# Altium schematic symbol library microbuilder.SCHLIB: 530 symbols (part 4 of 7) (continued)
## LPC1768
designator U?, comment LPC1768    100 MHz 32-bit ARM Cortex-M3 based microcontroller featuring a high level of integration and low power consumption. 512 kB Flash, 64 kB SRAM, USB Device/Host/OTG, Ethernet, CAN, I2S, 10-bit DAC    Digikey: 568-4796-ND
footprint LQFP100
pins: 1 TDO/SWO, 2 TDI, 3 TMS/SWDIO, 4 TRST, 5 TCK/SWDCLK, 6 P0[26]/AD0[3]/AOUT/RXD3, 7 P0[25]/AD0[2]/I2SRX_SDA/TXD3, 8 P0[24]/AD0[1]/I2SRX_WS/CAP3[1], 9 P0[23]/AD0[0]/I2SRX_CLK/CAP3[0], 10 VDDA (power), 11 VSSA (power), 12 VREFP (power), 13 N.C., 14 RSTOUT, 15 VREFN (power), 16 RTCX1, 17 RESET, 18 RTCX2, 19 VBAT (power), 20 P1[31]/SCK1/AD0[5], 21 P1[30]/VBUS/AD0[4], 22 XTAL1, 23 XTAL2, 24 P0[28]/SCL0/USB_SCL, 25 P0[27]/SDA0/USB_SDA, 26 P3[26]/STCLK/MAT0[1]/PWM1[3], 27 P3[25]/MAT0[0]/PWM1[2], 28 VDD(3V3)1 (power), 29 P0[29]/USB_D+, 30 P0[30]/USB_D-, 31 VSS1 (power), 32 P1[18]/USB_UP_LED/PWM1[1]/CAP1[0], 33 P1[19]/MC0A/USB_PPWR/CAP1[1], 34 P1[20]/MCFB0/PWM1[2]/SCK0, 35 P1[21]/MCABORT/PWM1[3]/SSEL0, 36 P1[22]/MC0B/USB_PWRD/MAT1[0], 37 P1[23]/MCFB1/PWM1[4]/MISO0, 38 P1[24]/MCFB2/PWM1[5]/MOSI0, 39 P1[25]/MC1A/MAT1[1], 40 P1[26]/MC1B/PWM1[6]/CAP0[0], 41 VSS2 (power), 42 VDD(REG)(3V3)1 (power), 43 P1[27]/CLKOUT/USB_OVRCR/CAP0[1], 44 P1[28]/MC2A/PCAP1[0]/MAT0[0], 45 P1[29]/MC2B/PCAP1[1]/MAT0[1], 46 P0[0]/RD1/TXD3/SDA1, 47 P0[1]/TD1/RXD3/SCL1, 48 P0[10]/TXD2/SDA2/MAT3[0], 49 P0[11]/RXD2/SCL2/MAT3[1], 50 P2[13]/EINT3/I2STX_SDA, 51 P2[12]/EINT2/I2STX_WS, 52 P2[11]/EINT1/I2STX_CLK, 53 P2[10]/EINT0/NMI, 54 VDD(3V3)2 (power), 55 VSS3 (power), 56 P0[22]/RTS1/TD1, 57 P0[21]/RI1/RD1, 58 P0[20]/DTR1/SCL1, 59 P0[19]/DSR1/SDA1, 60 P0[18]/DCD1/MOSI0/MOSI, 61 P0[17]/CTS1/MISO0/MISO, 62 P0[15]/TXD1/SCK0/SCK, 63 P0[16]/RXD1/SSEL0/SSEL, 64 P2[9]/USB_CONNECT/RXD2, 65 P2[8]/TD2/TXD2, 66 P2[7]/RD2/RTS1, 67 P2[6]/PCAP1[0]/RI1/TRACECLK, 68 P2[5]/PWM1[6]/DTR1/TRACEDATA[0], 69 P2[4]/PWM1[5]/DSR1/TRACEDATA[1], 70 P2[3]/PWM1[4]/DCD1/TRACEDATA[2], 71 VDD(3V3)3 (power), 72 VSS4 (power), 73 P2[2]/PWM1[3]/CTS1/TRACEDATA[3], 74 P2[1]/PWM1[2]/RXD1, 75 P2[0]/PWM1[1]/TXD1, 76 P0[9]/I2STX_SDA/MOSI1/MAT2[3], 77 P0[8]/I2STX_WS/MISO1/MAT2[2], 78 P0[7]/I2STX_CLK/SCK1/MAT2[1], 79 P0[6]/I2SRX_SDA/SSEL1/MAT2[0], 80 P0[5]/I2SRX_WS/TD2/CAP2[1], 81 P0[4]/I2SRX_CLK/RD2/CAP2[0], 82 P4[28]/RX_MCLK/MAT2[0]/TXD3, 83 VSS6 (power), 84 VDD(REG)(3V3)2 (power), 85 P4[29]/TX_MCLK/MAT2[1]/RXD3, 86 P1[17]/ENET_MDIO, 87 P1[16]/ENET_MDC, 88 P1[15]/ENET_REF_CLK, 89 P1[14]/ENET_RX_ER, 90 P1[10]/ENET_RXD1, 91 P1[9]/ENET_RXD0, 92 P1[8]/ENET_CRS, 93 P1[4]/ENET_TX_EN, 94 P1[1]/ENET_TXD1, 95 P1[0]/ENET_TXD0, 96 VDD(3V3)4 (power), 97 VSS5 (power), 98 P0[2]/TXD0/AD0[7], 99 P0[3]/RXD0/AD0[6], 100 RTCK

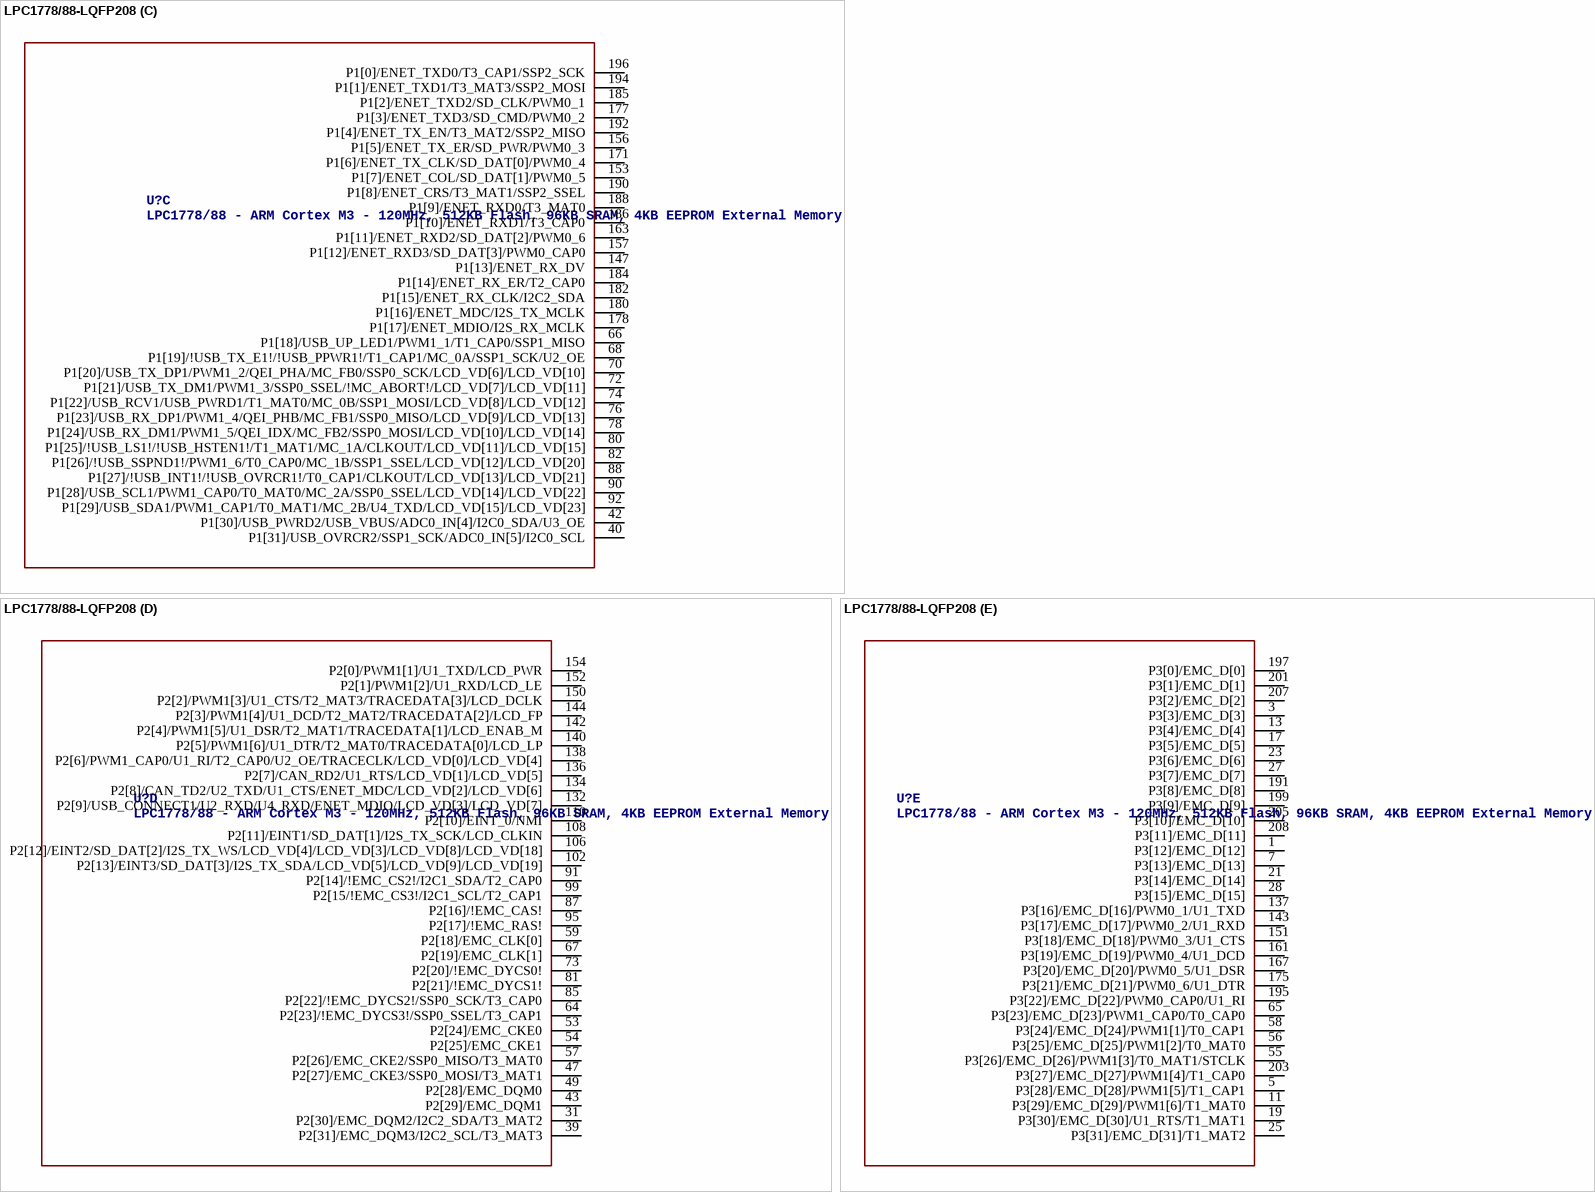
[diagram p34: symbol LPC1778/88-LQFP208]

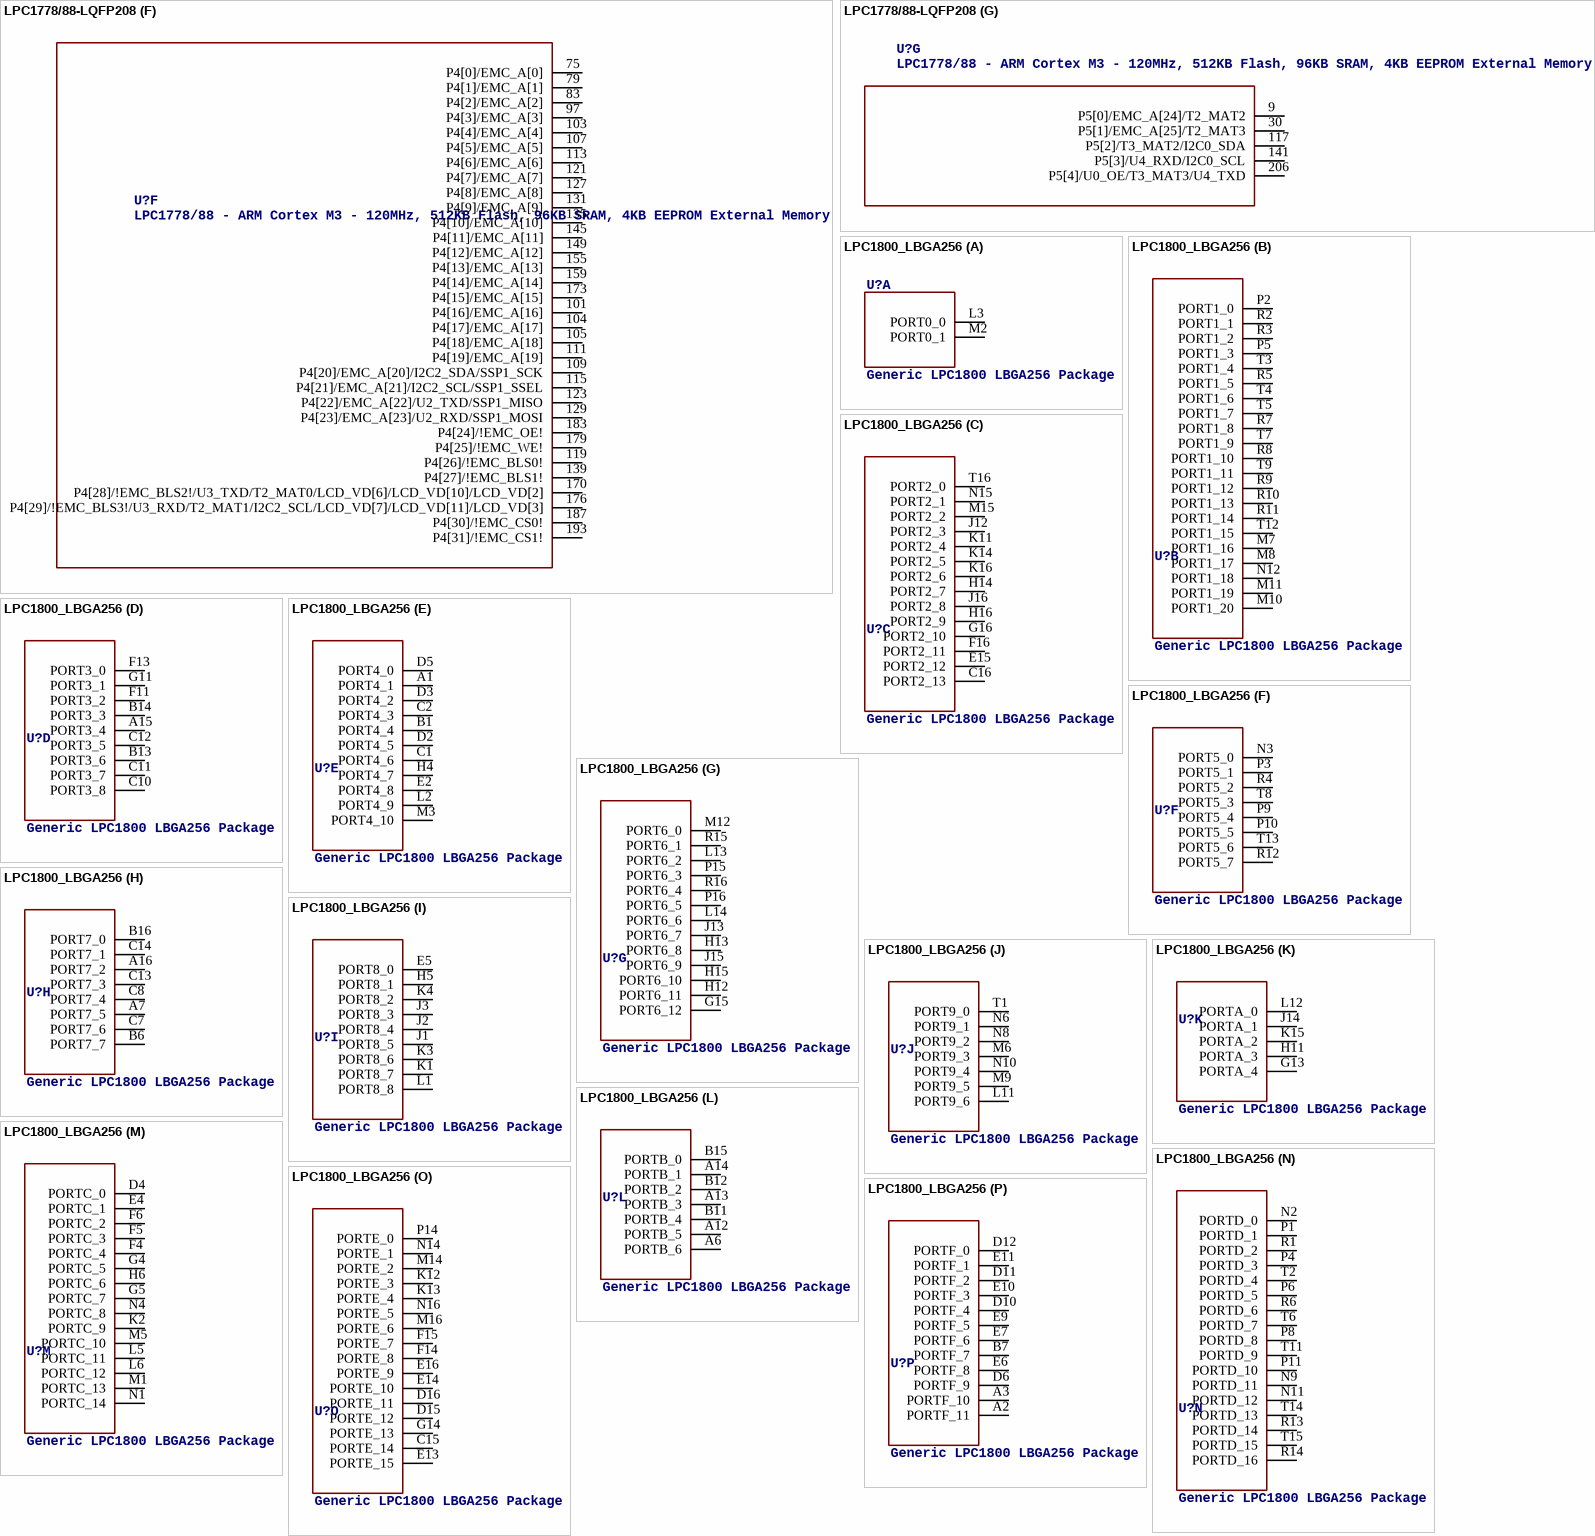
[diagram p35: symbols LPC1778/88-LQFP208 to LPC1800_LBGA256]

## LPC1778/88-LQFP208
designator U?, comment LPC1778/88 - ARM Cortex M3 - 120MHz, 512KB Flash, 96KB SRAM, 4KB EEPROM External Memory Controller  LCD Controller  10/100 Ethernet  USB 2.0 Host/Device/OTG  2 CAN  12-bit ADC  10-bit DAC  SD/MMC  I2S
footprint LQFP208
part A pins: 2 JTAG_TDO(SWO), 4 JTAG_TDI, 6 JTAG_TMS(SWDIO), 8 !JTAG_TRST!, 10 JTAG_TCK(SWDCLK), 15 VDD(3V3)1, 20 VDDA, 22 VSSA, 24 VREFP, 26 VDD(REG)(3V3)1, 29 !RSTOUT!, 32 VSS(REG)1, 33 VSS1, 34 RTCX1, 35 !RESET!, 36 RTCX2, 37 RTC_ALARM, 38 VBAT, 44 XTAL1, 46 XTAL2, 60 VDD(3V3)2, 63 VSS2, 71 VDD(3V3)3, 77 VSS3, 84 VSS(REG)2, 86 VDD(REG)(3V3)2, 89 VDD(3V3)4, 93 VSS4, 112 VDD(3V3)5, 114 VSS5, 125 VDD(3V3)6, 133 VSS6, 146 VDD(3V3)7, 148 VSS7, 165 VDD(3V3)8, 169 VSS8, 172 VSS(REG)3, 174 VDD(REG)(3V3)3, 181 VDD(3V3)9, 189 VSS9, 198 VDD(3V3)10, 200 VSS10
part B pins: 12 P0[26]/ADC0_IN[3]/DAC_OUT/U3_RXD, 14 P0[25]/ADC0_IN[2]/I2S_RX_SDA/U3_TXD, 16 P0[24]/ADC0_IN[1]/I2S_RX_WS/T3_CAP1, 18 P0[23]/ADC0_IN[0]/I2S_RX_SCK/T3_CAP0, 41 P0[12]/!USB_PPWR2!/SSP1_MISO/ADC0_IN[6], 45 P0[13]/USB_UP_LED2/SSP1_MOSI/ADC0_IN[7], 48 P0[28]/I2C0_SCL/USB_SCL1, 50 P0[27]/I2C0_SDA/USB_SDA1, 51 P0[31]/USB_D+2, 52 USB_D-2, 61 P0[29]/USB_D+1/EINT_0, 62 P0[30]/USB_D?1/EINT_1, 69 P0[14]/!USB_HSTEN2!/SSP1_SSEL/USB_CONNECT2, 94 P0[0]/CAN_RD1/U3_TXD/I2C1_SDA/U0_TXD, 96 P0[1]/CAN_TD1/U3_RXD/I2C1_SCL/U0_RXD, 98 P0[10]/U2_TXD/I2C2_SDA/T3_MAT0, 100 P0[11]/U2_RXD/I2C2_SCL/T3_MAT1, 116 P0[22]/U1_RTS/SD_DAT[0]/U4_TXD/CAN_TD1, 118 P0[21]/U1_RI/SD_PWR/U4_OE/CAN_RD1, 120 P0[20]/U1_DTR/SD_CMD/I2C1_SCL, 122 P0[19]/U1_DSR/SD_CLK/I2C1_SDA, 124 P0[18]/U1_DCD/SSP0_MOSI, 126 P0[17]/U1_CTS/SSP0_MISO, 128 P0[15]/U1_TXD/SSP0_SCK, 130 P0[16]/U1_RXD/SSP0_SSEL, 158 P0[9]/I2S_TX_SDA/SSP1_MOSI/T2_MAT3/LCD_VD[17], 160 P0[8]/I2S_TX_WS/SSP1_MISO/T2_MAT2/LCD_VD[16], 162 P0[7]/I2S_TX_SCK/SSP1_SCK/T2_MAT1/LCD_VD[9], 164 P0[6]/I2S_RX_SDA/SSP1_SSEL/T2_MAT0/U1_RTS/LCD_VD[8], 166 P0[5]/I2S_RX_WS/CAN_TD_2/T2_CAP1/LCD_VD[1], 168 P0[4]/I2S_RX_SCK/CAN_RD_2/T2_CAP0/LCD_VD[0], 202 P0[2]/U0_TXD/U3_TXD, 204 P0[3]/U0_RXD/U3_RXD
part C pins: 40 P1[31]/USB_OVRCR2/SSP1_SCK/ADC0_IN[5]/I2C0_SCL, 42 P1[30]/USB_PWRD2/USB_VBUS/ADC0_IN[4]/I2C0_SDA/U3_OE, 66 P1[18]/USB_UP_LED1/PWM1_1/T1_CAP0/SSP1_MISO, 68 P1[19]/!USB_TX_E1!/!USB_PPWR1!/T1_CAP1/MC_0A/SSP1_SCK/U2_OE, 70 P1[20]/USB_TX_DP1/PWM1_2/QEI_PHA/MC_FB0/SSP0_SCK/LCD_VD[6]/LCD_VD[10], 72 P1[21]/USB_TX_DM1/PWM1_3/SSP0_SSEL/!MC_ABORT!/LCD_VD[7]/LCD_VD[11], 74 P1[22]/USB_RCV1/USB_PWRD1/T1_MAT0/MC_0B/SSP1_MOSI/LCD_VD[8]/LCD_VD[12], 76 P1[23]/USB_RX_DP1/PWM1_4/QEI_PHB/MC_FB1/SSP0_MISO/LCD_VD[9]/LCD_VD[13], 78 P1[24]/USB_RX_DM1/PWM1_5/QEI_IDX/MC_FB2/SSP0_MOSI/LCD_VD[10]/LCD_VD[14], 80 P1[25]/!USB_LS1!/!USB_HSTEN1!/T1_MAT1/MC_1A/CLKOUT/LCD_VD[11]/LCD_VD[15], 82 P1[26]/!USB_SSPND1!/PWM1_6/T0_CAP0/MC_1B/SSP1_SSEL/LCD_VD[12]/LCD_VD[20], 88 P1[27]/!USB_INT1!/!USB_OVRCR1!/T0_CAP1/CLKOUT/LCD_VD[13]/LCD_VD[21], 90 P1[28]/USB_SCL1/PWM1_CAP0/T0_MAT0/MC_2A/SSP0_SSEL/LCD_VD[14]/LCD_VD[22], 92 P1[29]/USB_SDA1/PWM1_CAP1/T0_MAT1/MC_2B/U4_TXD/LCD_VD[15]/LCD_VD[23], 147 P1[13]/ENET_RX_DV, 153 P1[7]/ENET_COL/SD_DAT[1]/PWM0_5, 156 P1[5]/ENET_TX_ER/SD_PWR/PWM0_3, 157 P1[12]/ENET_RXD3/SD_DAT[3]/PWM0_CAP0, 163 P1[11]/ENET_RXD2/SD_DAT[2]/PWM0_6, 171 P1[6]/ENET_TX_CLK/SD_DAT[0]/PWM0_4, 177 P1[3]/ENET_TXD3/SD_CMD/PWM0_2, 178 P1[17]/ENET_MDIO/I2S_RX_MCLK, 180 P1[16]/ENET_MDC/I2S_TX_MCLK, 182 P1[15]/ENET_RX_CLK/I2C2_SDA, 184 P1[14]/ENET_RX_ER/T2_CAP0, 185 P1[2]/ENET_TXD2/SD_CLK/PWM0_1, 186 P1[10]/ENET_RXD1/T3_CAP0, 188 P1[9]/ENET_RXD0/T3_MAT0, 190 P1[8]/ENET_CRS/T3_MAT1/SSP2_SSEL, 192 P1[4]/ENET_TX_EN/T3_MAT2/SSP2_MISO, 194 P1[1]/ENET_TXD1/T3_MAT3/SSP2_MOSI, 196 P1[0]/ENET_TXD0/T3_CAP1/SSP2_SCK
part D pins: 31 P2[30]/EMC_DQM2/I2C2_SDA/T3_MAT2, 39 P2[31]/EMC_DQM3/I2C2_SCL/T3_MAT3, 43 P2[29]/EMC_DQM1, 47 P2[27]/EMC_CKE3/SSP0_MOSI/T3_MAT1, 49 P2[28]/EMC_DQM0, 53 P2[24]/EMC_CKE0, 54 P2[25]/EMC_CKE1, 57 P2[26]/EMC_CKE2/SSP0_MISO/T3_MAT0, 59 P2[18]/EMC_CLK[0], 64 P2[23]/!EMC_DYCS3!/SSP0_SSEL/T3_CAP1, 67 P2[19]/EMC_CLK[1], 73 P2[20]/!EMC_DYCS0!, 81 P2[21]/!EMC_DYCS1!, 85 P2[22]/!EMC_DYCS2!/SSP0_SCK/T3_CAP0, 87 P2[16]/!EMC_CAS!, 91 P2[14]/!EMC_CS2!/I2C1_SDA/T2_CAP0, 95 P2[17]/!EMC_RAS!, 99 P2[15/!EMC_CS3!/I2C1_SCL/T2_CAP1, 102 P2[13]/EINT3/SD_DAT[3]/I2S_TX_SDA/LCD_VD[5]/LCD_VD[9]/LCD_VD[19], 106 P2[12]/EINT2/SD_DAT[2]/I2S_TX_WS/LCD_VD[4]/LCD_VD[3]/LCD_VD[8]/LCD_VD[18], 108 P2[11]/EINT1/SD_DAT[1]/I2S_TX_SCK/LCD_CLKIN, 110 P2[10]/EINT_0/NMI, 132 P2[9]/USB_CONNECT1/U2_RXD/U4_RXD/ENET_MDIO/LCD_VD[3]/LCD_VD[7], 134 P2[8]/CAN_TD2/U2_TXD/U1_CTS/ENET_MDC/LCD_VD[2]/LCD_VD[6], 136 P2[7]/CAN_RD2/U1_RTS/LCD_VD[1]/LCD_VD[5], 138 P2[6]/PWM1_CAP0/U1_RI/T2_CAP0/U2_OE/TRACECLK/LCD_VD[0]/LCD_VD[4], 140 P2[5]/PWM1[6]/U1_DTR/T2_MAT0/TRACEDATA[0]/LCD_LP, 142 P2[4]/PWM1[5]/U1_DSR/T2_MAT1/TRACEDATA[1]/LCD_ENAB_M, 144 P2[3]/PWM1[4]/U1_DCD/T2_MAT2/TRACEDATA[2]/LCD_FP, 150 P2[2]/PWM1[3]/U1_CTS/T2_MAT3/TRACEDATA[3]/LCD_DCLK, 152 P2[1]/PWM1[2]/U1_RXD/LCD_LE, 154 P2[0]/PWM1[1]/U1_TXD/LCD_PWR
part E pins: 1 P3[12]/EMC_D[12], 3 P3[3]/EMC_D[3], 5 P3[28]/EMC_D[28]/PWM1[5]/T1_CAP1, 7 P3[13]/EMC_D[13], 11 P3[29]/EMC_D[29]/PWM1[6]/T1_MAT0, 13 P3[4]/EMC_D[4], 17 P3[5]/EMC_D[5], 19 P3[30]/EMC_D[30]/U1_RTS/T1_MAT1, 21 P3[14]/EMC_D[14], 23 P3[6]/EMC_D[6], 25 P3[31]/EMC_D[31]/T1_MAT2, 27 P3[7]/EMC_D[7], 28 P3[15]/EMC_D[15], 55 P3[26]/EMC_D[26]/PWM1[3]/T0_MAT1/STCLK, 56 P3[25]/EMC_D[25]/PWM1[2]/T0_MAT0, 58 P3[24]/EMC_D[24]/PWM1[1]/T0_CAP1, 65 P3[23]/EMC_D[23]/PWM1_CAP0/T0_CAP0, 137 P3[16]/EMC_D[16]/PWM0_1/U1_TXD, 143 P3[17]/EMC_D[17]/PWM0_2/U1_RXD, 151 P3[18]/EMC_D[18]/PWM0_3/U1_CTS, 161 P3[19]/EMC_D[19]/PWM0_4/U1_DCD, 167 P3[20]/EMC_D[20]/PWM0_5/U1_DSR, 175 P3[21]/EMC_D[21]/PWM0_6/U1_DTR, 191 P3[8]/EMC_D[8], 195 P3[22]/EMC_D[22]/PWM0_CAP0/U1_RI, 197 P3[0]/EMC_D[0], 199 P3[9]/EMC_D[9], 201 P3[1]/EMC_D[1], 203 P3[27]/EMC_D[27]/PWM1[4]/T1_CAP0, 205 P3[10]/EMC_D[10], 207 P3[2]/EMC_D[2], 208 P3[11]/EMC_D[11]
part F pins: 75 P4[0]/EMC_A[0], 79 P4[1]/EMC_A[1], 83 P4[2]/EMC_A[2], 97 P4[3]/EMC_A[3], 101 P4[16]/EMC_A[16], 103 P4[4]/EMC_A[4], 104 P4[17]/EMC_A[17], 105 P4[18]/EMC_A[18], 107 P4[5]/EMC_A[5], 109 P4[20]/EMC_A[20]/I2C2_SDA/SSP1_SCK, 111 P4[19]/EMC_A[19], 113 P4[6]/EMC_A[6], 115 P4[21]/EMC_A[21]/I2C2_SCL/SSP1_SSEL, 119 P4[26]/!EMC_BLS0!, 121 P4[7]/EMC_A[7], 123 P4[22]/EMC_A[22]/U2_TXD/SSP1_MISO, 127 P4[8]/EMC_A[8], 129 P4[23]/EMC_A[23]/U2_RXD/SSP1_MOSI, 131 P4[9]/EMC_A[9], 135 P4[10]/EMC_A[10], 139 P4[27]/!EMC_BLS1!, 145 P4[11]/EMC_A[11], 149 P4[12]/EMC_A[12], 155 P4[13]/EMC_A[13], 159 P4[14]/EMC_A[14], 170 P4[28]/!EMC_BLS2!/U3_TXD/T2_MAT0/LCD_VD[6]/LCD_VD[10]/LCD_VD[2], 173 P4[15]/EMC_A[15], 176 P4[29]/!EMC_BLS3!/U3_RXD/T2_MAT1/I2C2_SCL/LCD_VD[7]/LCD_VD[11]/LCD_VD[3], 179 P4[25]/!EMC_WE!, 183 P4[24]/!EMC_OE!, 187 P4[30]/!EMC_CS0!, 193 P4[31]/!EMC_CS1!
part G pins: 9 P5[0]/EMC_A[24]/T2_MAT2, 30 P5[1]/EMC_A[25]/T2_MAT3, 117 P5[2]/T3_MAT2/I2C0_SDA, 141 P5[3]/U4_RXD/I2C0_SCL, 206 P5[4]/U0_OE/T3_MAT3/U4_TXD

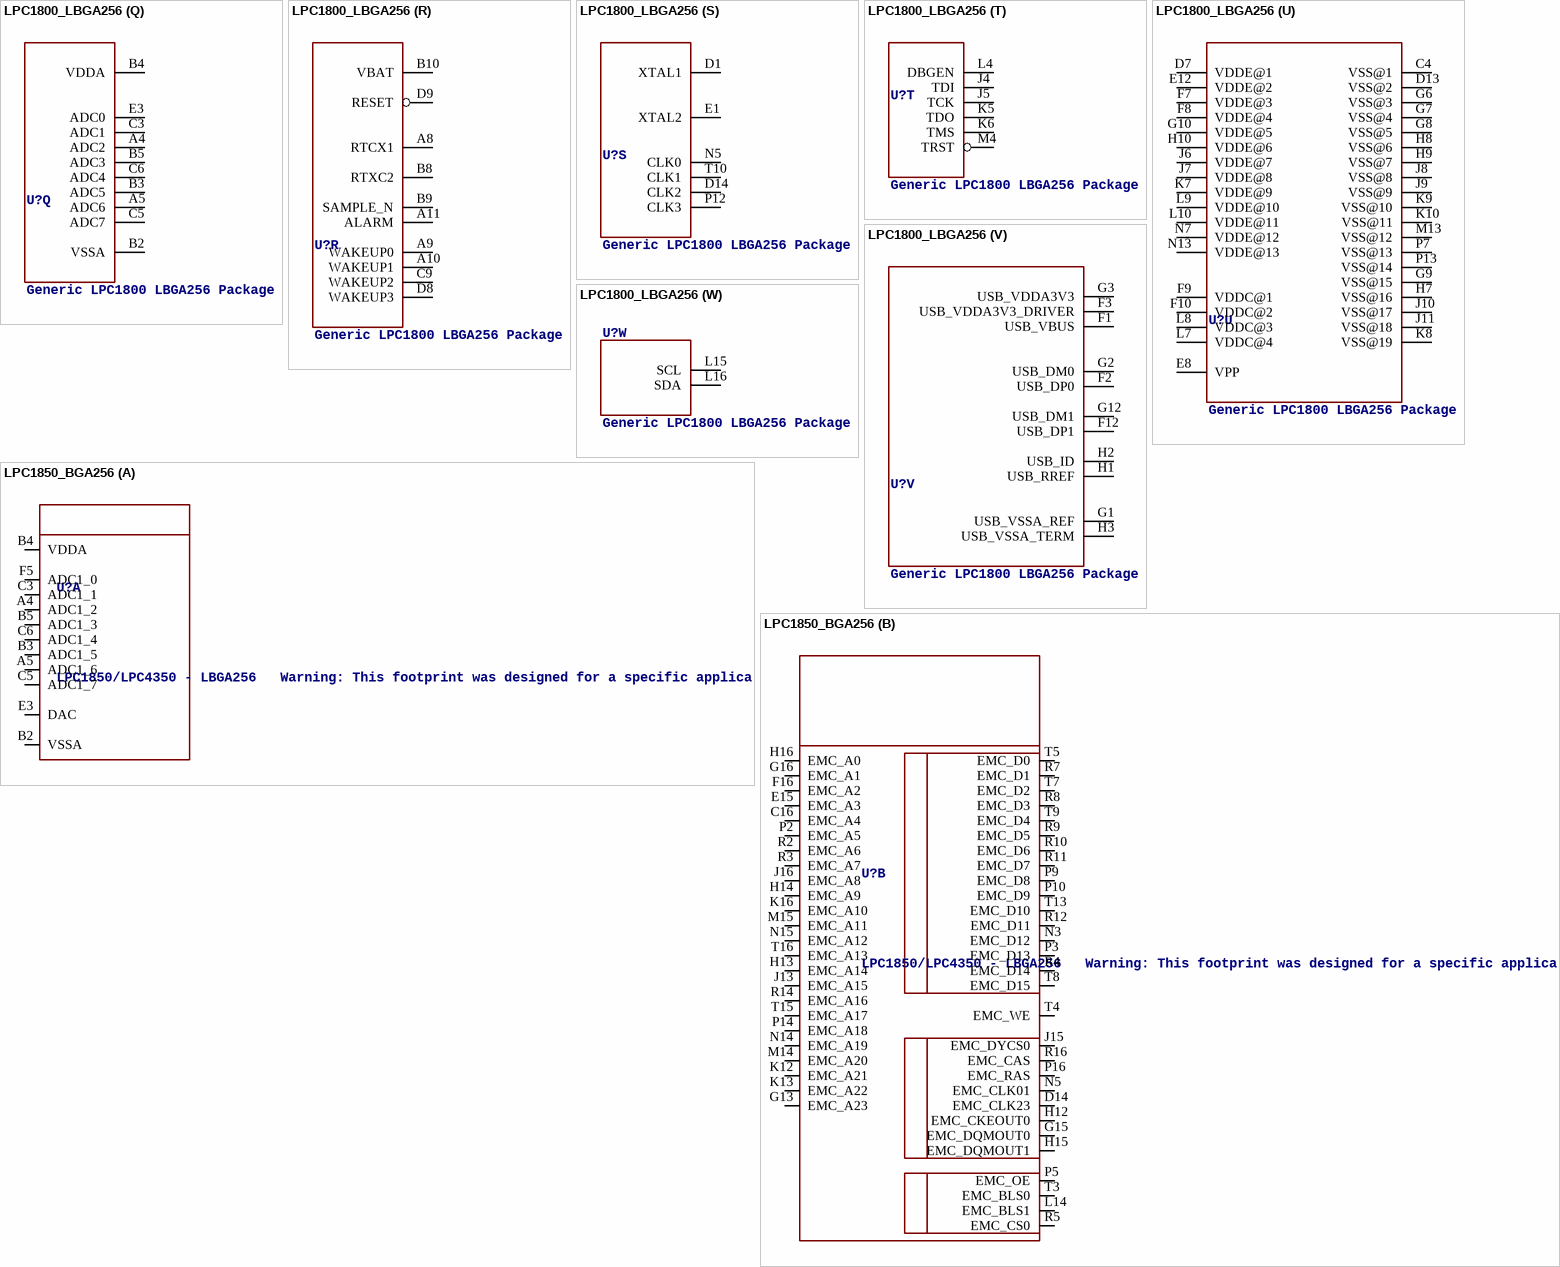
[diagram p36: symbols LPC1800_LBGA256 to LPC1850_BGA256]

## LPC1800_LBGA256
designator U?, comment Generic LPC1800 LBGA256 Package
footprint LBGA256_1.0MM
part A pins: L3 PORT0_0, M2 PORT0_1
part B pins: M7 PORT1_16, M8 PORT1_17, M10 PORT1_20, M11 PORT1_19, N12 PORT1_18, P2 PORT1_0, P5 PORT1_3, R2 PORT1_1, R3 PORT1_2, R5 PORT1_5, R7 PORT1_8, R8 PORT1_10, R9 PORT1_12, R10 PORT1_13, R11 PORT1_14, T3 PORT1_4, T4 PORT1_6, T5 PORT1_7, T7 PORT1_9, T9 PORT1_11, T12 PORT1_15
part C pins: C16 PORT2_13, E15 PORT2_12, F16 PORT2_11, G16 PORT2_10, H14 PORT2_7, H16 PORT2_9, J12 PORT2_3, J16 PORT2_8, K11 PORT2_4, K14 PORT2_5, K16 PORT2_6, M15 PORT2_2, N15 PORT2_1, T16 PORT2_0
part D pins: A15 PORT3_4, B13 PORT3_6, B14 PORT3_3, C10 PORT3_8, C11 PORT3_7, C12 PORT3_5, F11 PORT3_2, F13 PORT3_0, G11 PORT3_1
part E pins: A1 PORT4_1, B1 PORT4_4, C1 PORT4_6, C2 PORT4_3, D2 PORT4_5, D3 PORT4_2, D5 PORT4_0, E2 PORT4_8, H4 PORT4_7, L2 PORT4_9, M3 PORT4_10
part F pins: N3 PORT5_0, P3 PORT5_1, P9 PORT5_4, P10 PORT5_5, R4 PORT5_2, R12 PORT5_7, T8 PORT5_3, T13 PORT5_6
part G pins: G15 PORT6_12, H12 PORT6_11, H13 PORT6_8, H15 PORT6_10, J13 PORT6_7, J15 PORT6_9, L13 PORT6_2, L14 PORT6_6, M12 PORT6_0, P15 PORT6_3, P16 PORT6_5, R15 PORT6_1, R16 PORT6_4
part H pins: A7 PORT7_5, A16 PORT7_2, B6 PORT7_7, B16 PORT7_0, C7 PORT7_6, C8 PORT7_4, C13 PORT7_3, C14 PORT7_1
part I pins: E5 PORT8_0, H5 PORT8_1, J1 PORT8_5, J2 PORT8_4, J3 PORT8_3, K1 PORT8_7, K3 PORT8_6, K4 PORT8_2, L1 PORT8_8 (oe)
part J pins: L11 PORT9_6, M6 PORT9_3, M9 PORT9_5, N6 PORT9_1, N8 PORT9_2, N10 PORT9_4, T1 PORT9_0
part K pins: G13 PORTA_4, H11 PORTA_3, J14 PORTA_1, K15 PORTA_2, L12 PORTA_0
part L pins: A6 PORTB_6, A12 PORTB_5, A13 PORTB_3, A14 PORTB_1, B11 PORTB_4, B12 PORTB_2, B15 PORTB_0
part M pins: D4 PORTC_0, E4 PORTC_1, F4 PORTC_4, F5 PORTC_3, F6 PORTC_2, G4 PORTC_5, G5 PORTC_7, H6 PORTC_6, K2 PORTC_9, L5 PORTC_11, L6 PORTC_12, M1 PORTC_13, M5 PORTC_10, N1 PORTC_14, N4 PORTC_8
part N pins: N2 PORTD_0, N9 PORTD_11, N11 PORTD_12, P1 PORTD_1, P4 PORTD_3, P6 PORTD_5, P8 PORTD_8, P11 PORTD_10, R1 PORTD_2, R6 PORTD_6, R13 PORTD_14, R14 PORTD_16, T2 PORTD_4, T6 PORTD_7, T11 PORTD_9, T14 PORTD_13, T15 PORTD_15
part O pins: C15 PORTE_14, D15 PORTE_12, D16 PORTE_11, E13 PORTE_15, E14 PORTE_10, E16 PORTE_9, F14 PORTE_8, F15 PORTE_7, G14 PORTE_13, K12 PORTE_3, K13 PORTE_4, M14 PORTE_2, M16 PORTE_6, N14 PORTE_1, N16 PORTE_5, P14 PORTE_0
part P pins: A2 PORTF_11, A3 PORTF_10, B7 PORTF_7, D6 PORTF_9, D10 PORTF_4, D11 PORTF_2, D12 PORTF_0, E6 PORTF_8, E7 PORTF_6, E9 PORTF_5, E10 PORTF_3, E11 PORTF_1
part Q pins: A4 ADC2, A5 ADC6, B2 VSSA (oe), B3 ADC5, B4 VDDA (oe), B5 ADC3, C3 ADC1, C5 ADC7, C6 ADC4, E3 ADC0
part R pins: A8 RTCX1, A9 WAKEUP0, A10 WAKEUP1, A11 ALARM, B8 RTXC2, B9 SAMPLE_N, B10 VBAT, C9 WAKEUP2, D8 WAKEUP3, D9 RESET
part S pins: D1 XTAL1, D14 CLK2, E1 XTAL2, N5 CLK0, P12 CLK3, T10 CLK1
part T pins: J4 TDI, J5 TCK, K5 TDO, K6 TMS, L4 DBGEN, M4 TRST
part U pins: C4 VSS@1 (oe), D7 VDDE@1 (oe), D13 VSS@2 (oe), E8 VPP (oe), E12 VDDE@2 (oe), F7 VDDE@3 (oe), F8 VDDE@4 (oe), F9 VDDC@1 (oe), F10 VDDC@2 (oe), G6 VSS@3 (oe), G7 VSS@4 (oe), G8 VSS@5 (oe), G9 VSS@15 (oe), G10 VDDE@5 (oe), H7 VSS@16 (oe), H8 VSS@6 (oe), H9 VSS@7 (oe), H10 VDDE@6 (oe), J6 VDDE@7 (oe), J7 VDDE@8 (oe), J8 VSS@8 (oe), J9 VSS@9 (oe), J10 VSS@17 (oe), J11 VSS@18 (oe), K7 VDDE@9 (oe), K8 VSS@19 (oe), K9 VSS@10 (oe), K10 VSS@11 (oe), L7 VDDC@4 (oe), L8 VDDC@3 (oe), L9 VDDE@10 (oe), L10 VDDE@11 (oe), M13 VSS@12 (oe), N7 VDDE@12 (oe), N13 VDDE@13 (oe), P7 VSS@13 (oe), P13 VSS@14 (oe)
part V pins: F1 USB_VBUS, F2 USB_DP0, F3 USB_VDDA3V3_DRIVER, F12 USB_DP1, G1 USB_VSSA_REF, G2 USB_DM0, G3 USB_VDDA3V3, G12 USB_DM1, H1 USB_RREF, H2 USB_ID, H3 USB_VSSA_TERM
part W pins: L15 SCL (oe), L16 SDA (oe)

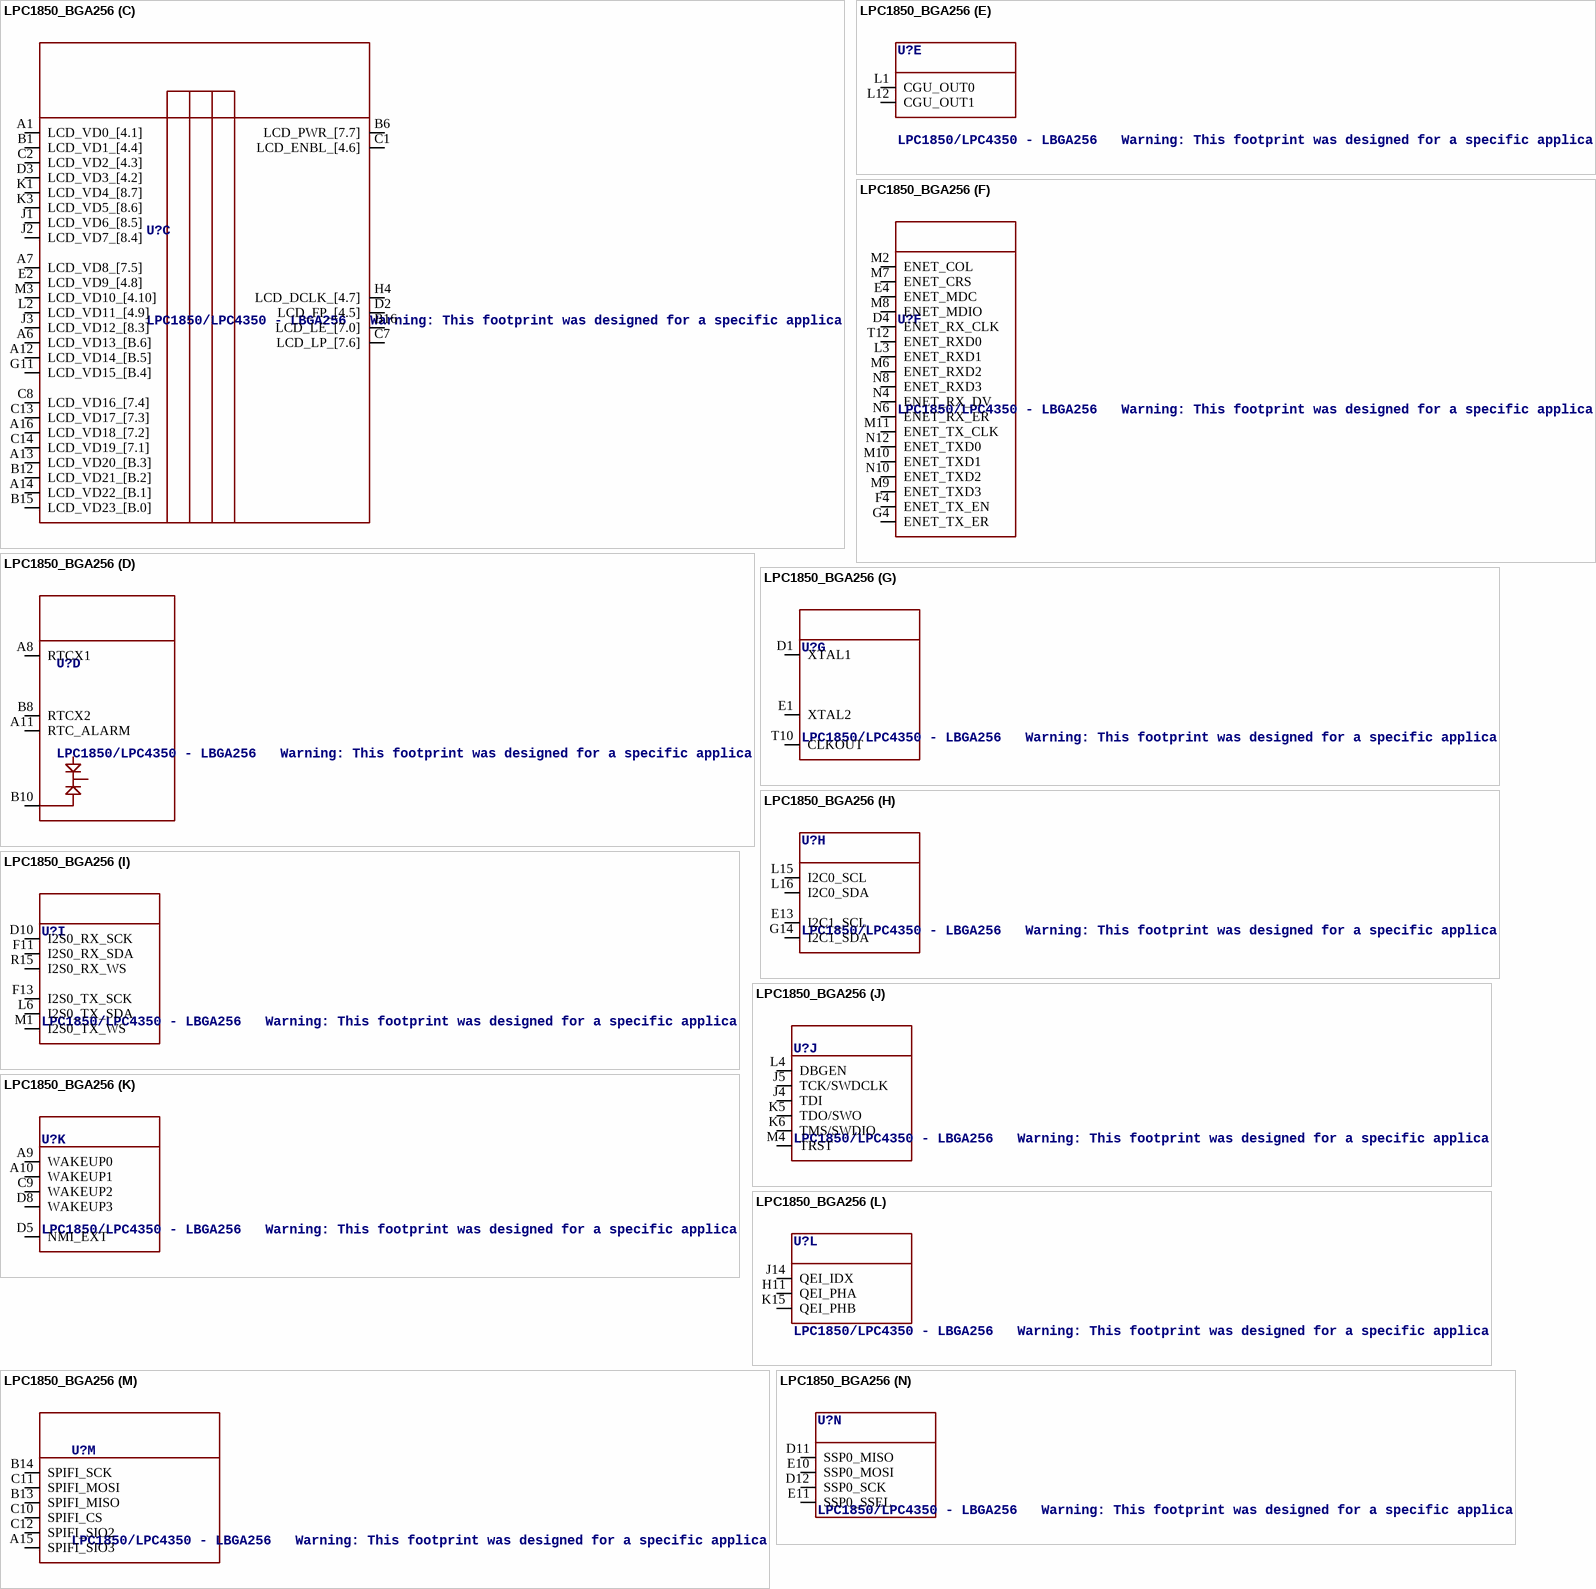
[diagram p37: symbol LPC1850_BGA256]

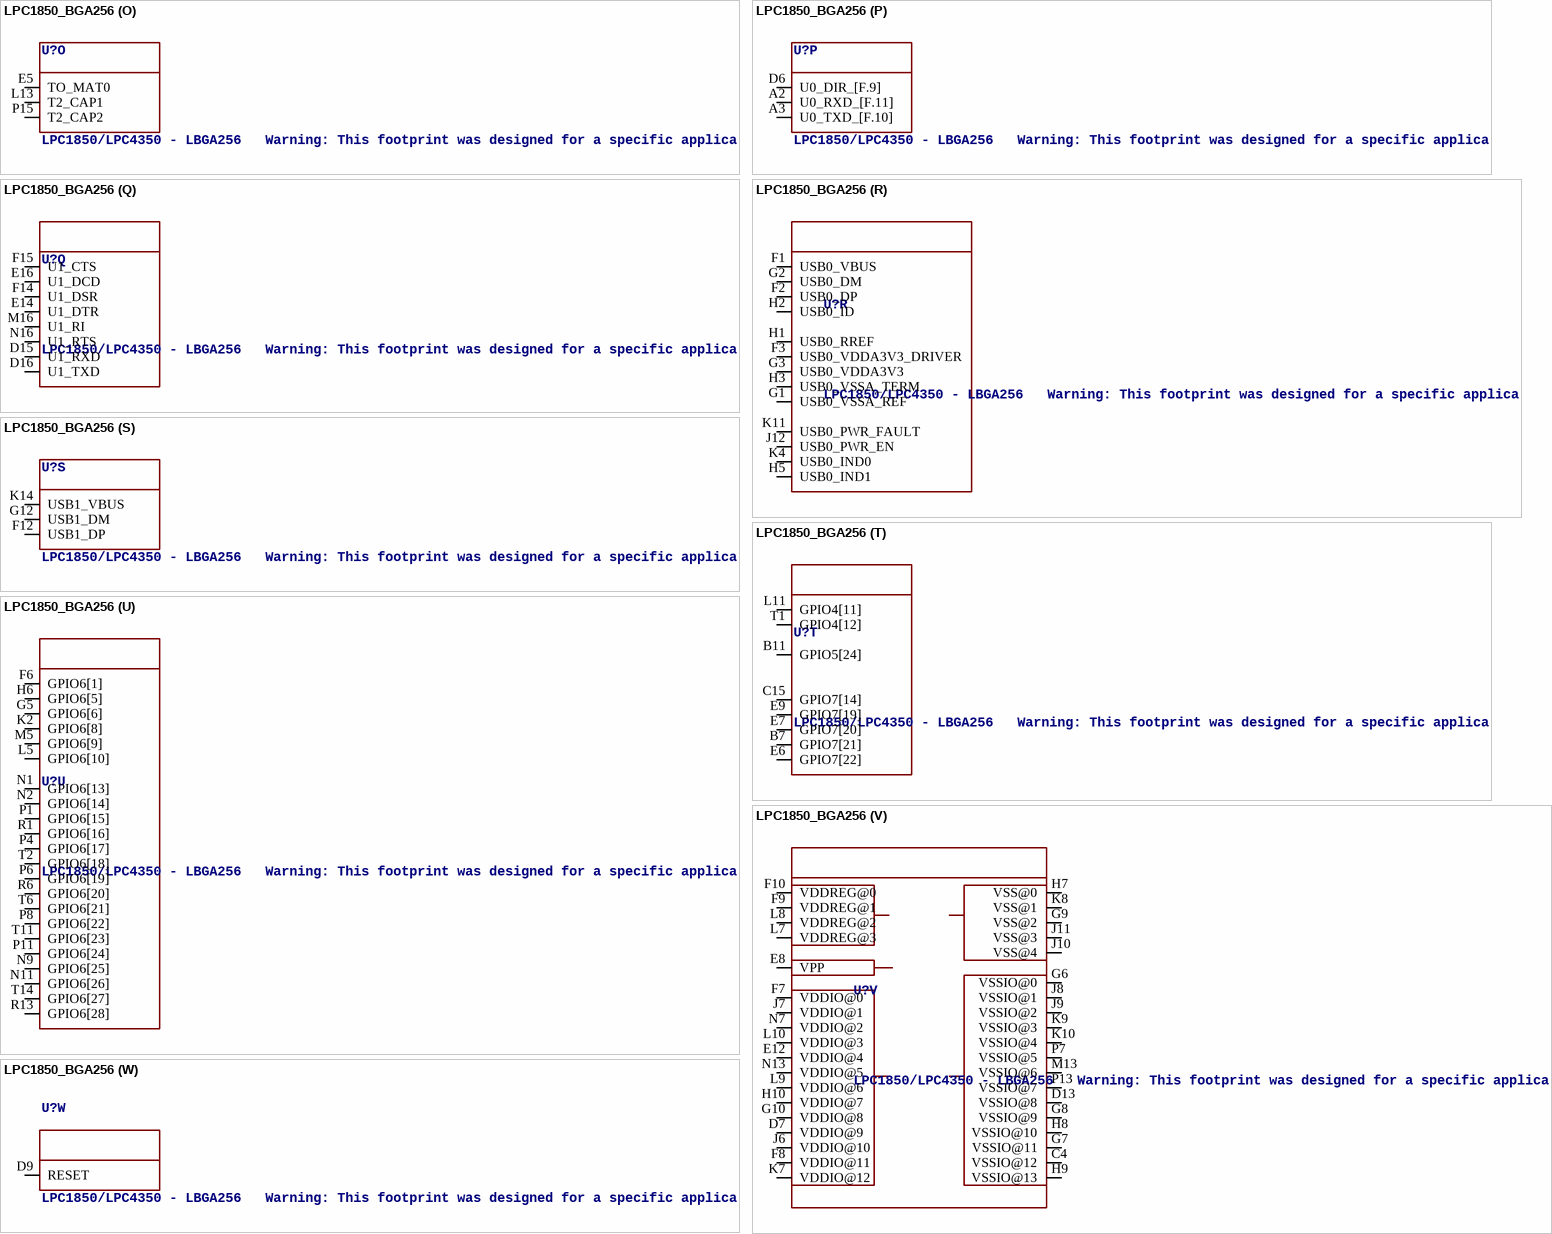
[diagram p38: symbol LPC1850_BGA256]